# Altium footprint library Connectors Pad Lib.PcbLib: 211 footprints (part 12 of 14)
Each footprint in its own frame and in the unit in brackets; x right, y up, seen from the top. Pads: shape width x height; smd on the part's side, far side on the other; paste and mask are expansions set on the pad; w line width, h text height; cw(c..) or ccw(c..) is an arc to the next point about the centre after c.
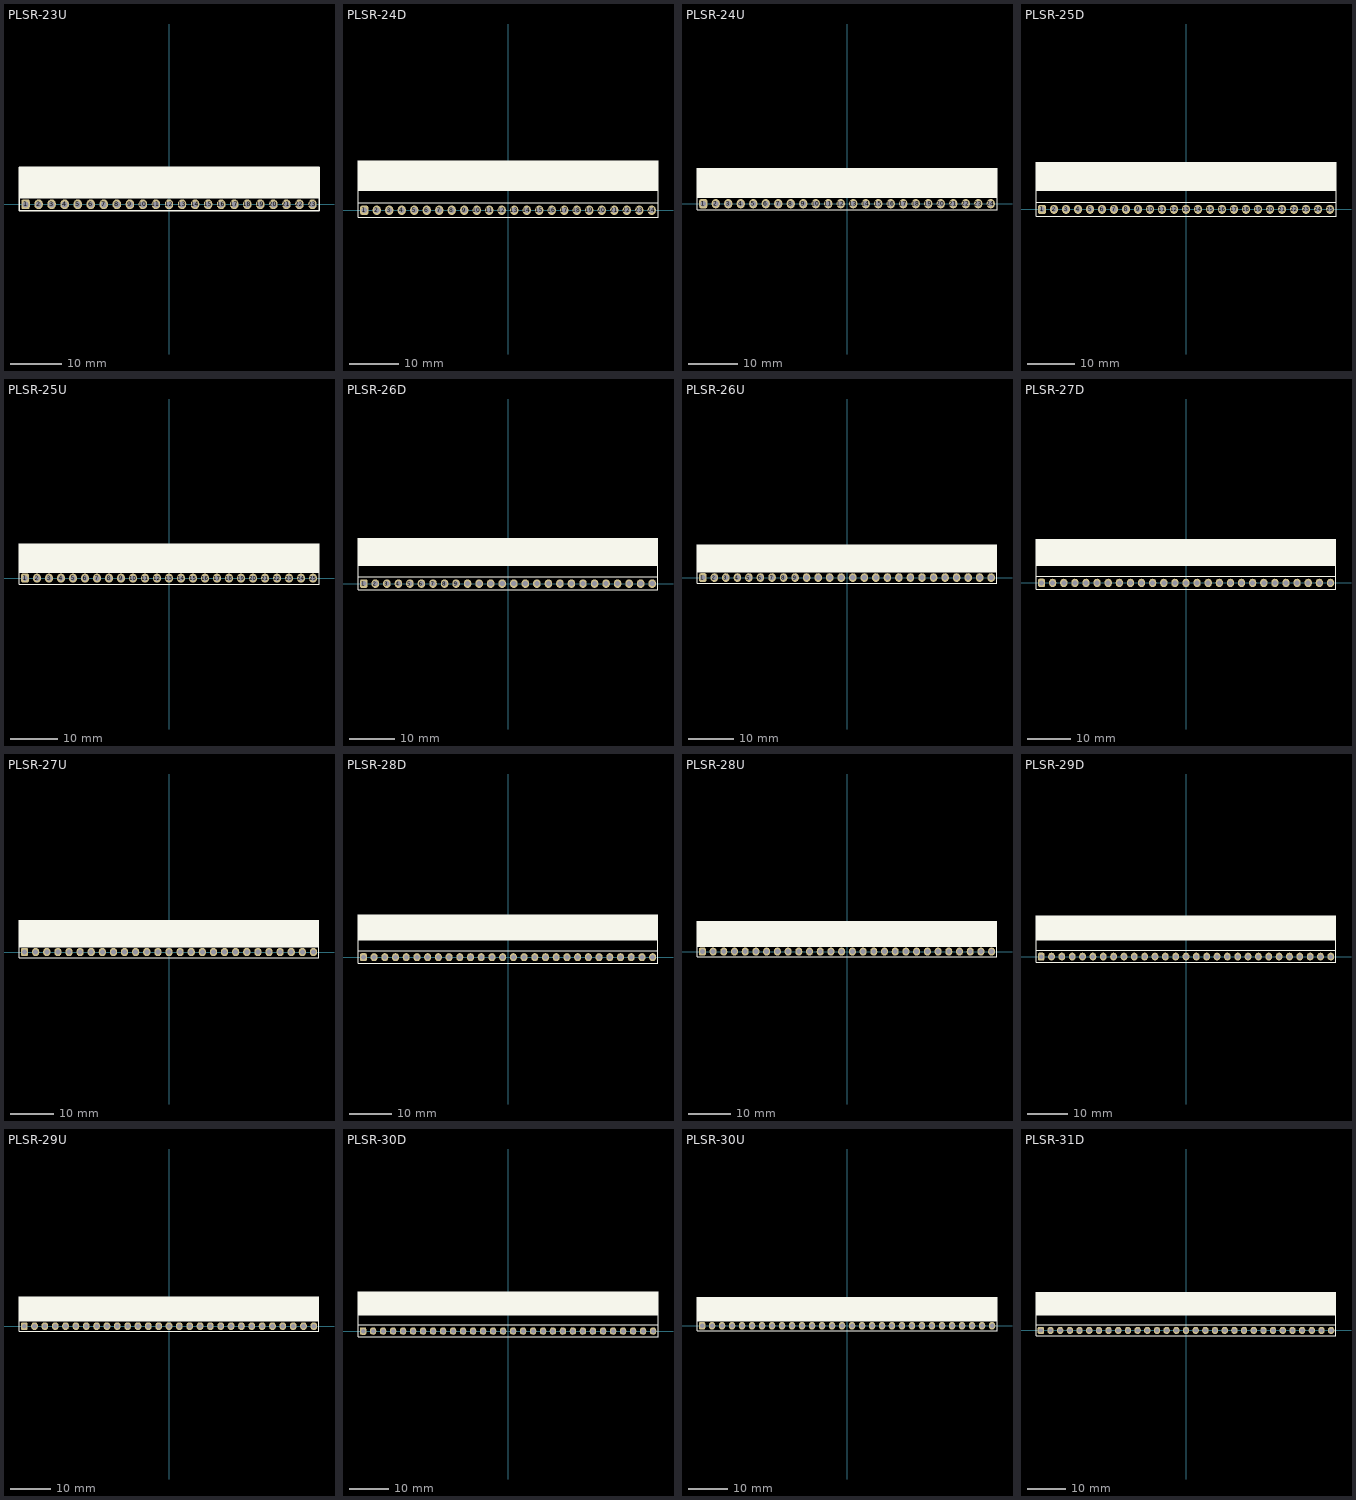
[diagram p11: the footprints below, top view; thin cyan lines are the x and y axes]

## PLSR-23U [mil] "PCB Right Angled Single Connector (U Type) 23-Pin"
height 236.3
pads (23):
  rrect50% 65x75 hole 45: 1(-1100,0)
  oval 65x75 hole 45: 2(-1000,0) 3(-900,0) 4(-800,0) 5(-700,0) 6(-600,0) 7(-500,0) 8(-400,0) 9(-300,0) 10(-200,0) 11(-100,0) 12(0,0) 13(100,0) 14(200,0) 15(300,0) 16(400,0) 17(500,0) 18(600,0) 19(700,0) 20(800,0) 21(900,0) 22(1000,0) 23(1100,0)
Top Overlay:
  rectangle: -1150,50 1150,285
  lines w10: -1150,50 1150,50 ; -1150,-50 -1150,285 1150,285 1150,-50 -1150,-50
3D body "PLSRU-23.STEP": height 239.98, standoff -117.11, extent -1150,-50 1150,286.22

## PLSR-24D [mil] "PCB Right Angled Single Connector (D Type) 24-Pin"
height 98.42
pads (24):
  rrect50% 65x75 hole 45: 1(-1150,0)
  oval 65x75 hole 45: 2(-1050,0) 3(-950,0) 4(-850,0) 5(-750,0) 6(-650,0) 7(-550,0) 8(-450,0) 9(-350,0) 10(-250,0) 11(-150,0) 12(-50,0) 13(50,0) 14(150,0) 15(250,0) 16(350,0) 17(450,0) 18(550,0) 19(650,0) 20(750,0) 21(850,0) 22(950,0) 23(1050,0) 24(1150,0)
Top Overlay:
  rectangle: -1200,160 1200,395
  lines w10: -1200,61 1200,61 ; -1200,161 1200,161 ; -1200,-55 1200,-55 1200,395 -1200,395 -1200,-55
3D body "PLSR-24D.STEP": height 101, standoff -117.11, extent -1200,-11.02 1200,396.85

## PLSR-24U [mil] "PCB Right Angled Single Connector (U Type) 24-Pin"
height 236.3
pads (24):
  rrect50% 65x75 hole 45: 1(-1150,0)
  oval 65x75 hole 45: 2(-1050,0) 3(-950,0) 4(-850,0) 5(-750,0) 6(-650,0) 7(-550,0) 8(-450,0) 9(-350,0) 10(-250,0) 11(-150,0) 12(-50,0) 13(50,0) 14(150,0) 15(250,0) 16(350,0) 17(450,0) 18(550,0) 19(650,0) 20(750,0) 21(850,0) 22(950,0) 23(1050,0) 24(1150,0)
Top Overlay:
  rectangle: -1200,50 1200,285
  lines w10: -1200,50 1200,50 ; -1200,-50 1200,-50 1200,285 -1200,285 -1200,-50
3D body "PLSRU-24.STEP": height 239.98, standoff -117.11, extent -1200,-50 1200,286.22

## PLSR-25D [mil] "PCB Right Angled Single Connector (D Type) 25-Pin"
height 98.42
pads (25):
  rrect50% 65x75 hole 45: 1(-1200,0)
  oval 65x75 hole 45: 2(-1100,0) 3(-1000,0) 4(-900,0) 5(-800,0) 6(-700,0) 7(-600,0) 8(-500,0) 9(-400,0) 10(-300,0) 11(-200,0) 12(-100,0) 13(0,0) 14(100,0) 15(200,0) 16(300,0) 17(400,0) 18(500,0) 19(600,0) 20(700,0) 21(800,0) 22(900,0) 23(1000,0) 24(1100,0) 25(1200,0)
Top Overlay:
  rectangle: -1250,160 1250,395
  lines w10: -1250,61 1250,61 ; -1250,161 1250,161 ; -1250,-55 1250,-55 1250,395 -1250,395 -1250,-55
3D body "PLSR-25D.STEP": height 101, standoff -117.11, extent -1250,-11.02 1250,396.85

## PLSR-25U [mil] "PCB Right Angled Single Connector (U Type) 25-Pin"
height 236.3
pads (25):
  rrect50% 65x75 hole 45: 1(-1200,0)
  oval 65x75 hole 45: 2(-1100,0) 3(-1000,0) 4(-900,0) 5(-800,0) 6(-700,0) 7(-600,0) 8(-500,0) 9(-400,0) 10(-300,0) 11(-200,0) 12(-100,0) 13(0,0) 14(100,0) 15(200,0) 16(300,0) 17(400,0) 18(500,0) 19(600,0) 20(700,0) 21(800,0) 22(900,0) 23(1000,0) 24(1100,0) 25(1200,0)
Top Overlay:
  rectangle: -1250,50 1250,285
  lines w10: -1250,50 1250,50 ; -1250,-50 1250,-50 1250,285 -1250,285 -1250,-50
3D body "PLSRU-25.STEP": height 239.98, standoff -117.11, extent -1250,-50 1250,286.22

## PLSR-26D [mil] "PCB Right Angled Single Connector (D Type) 26-Pin"
height 98.42
pads (26):
  rrect50% 65x75 hole 45: 1(-1250,0)
  oval 65x75 hole 45: 2(-1150,0) 3(-1050,0) 4(-950,0) 5(-850,0) 6(-750,0) 7(-650,0) 8(-550,0) 9(-450,0) 10(-350,0) 11(-250,0) 12(-150,0) 13(-50,0) 14(50,0) 15(150,0) 16(250,0) 17(350,0) 18(450,0) 19(550,0) 20(650,0) 21(750,0) 22(850,0) 23(950,0) 24(1050,0) 25(1150,0) 26(1250,0)
Top Overlay:
  rectangle: -1300,160 1300,395
  lines w10: -1300,61 1300,61 ; -1300,161 1300,161 ; -1300,-55 1300,-55 1300,395 -1300,395 -1300,-55
3D body "PLSR-26D.STEP": height 101, standoff -117.11, extent -1300,-11.02 1300,396.85

## PLSR-26U [mil] "PCB Right Angled Single Connector (U Type) 26-Pin"
height 236.3
pads (26):
  rrect50% 65x75 hole 45: 1(-1250,0)
  oval 65x75 hole 45: 2(-1150,0) 3(-1050,0) 4(-950,0) 5(-850,0) 6(-750,0) 7(-650,0) 8(-550,0) 9(-450,0) 10(-350,0) 11(-250,0) 12(-150,0) 13(-50,0) 14(50,0) 15(150,0) 16(250,0) 17(350,0) 18(450,0) 19(550,0) 20(650,0) 21(750,0) 22(850,0) 23(950,0) 24(1050,0) 25(1150,0) 26(1250,0)
Top Overlay:
  rectangle: -1300,50 1300,285
  lines w10: -1300,50 1300,50 ; -1300,-50 1300,-50 1300,285 -1300,285 -1300,-50
3D body "PLSR-26D.STEP": height 101, standoff -117.11, extent -1300,-11.02 1300,396.85

## PLSR-27D [mil] "PCB Right Angled Single Connector (D Type) 27-Pin"
height 98.42
pads (27):
  rrect50% 65x75 hole 45: 1(-1300,0)
  oval 65x75 hole 45: 2(-1200,0) 3(-1100,0) 4(-1000,0) 5(-900,0) 6(-800,0) 7(-700,0) 8(-600,0) 9(-500,0) 10(-400,0) 11(-300,0) 12(-200,0) 13(-100,0) 14(0,0) 15(100,0) 16(200,0) 17(300,0) 18(400,0) 19(500,0) 20(600,0) 21(700,0) 22(800,0) 23(900,0) 24(1000,0) 25(1100,0) 26(1200,0) 27(1300,0)
Top Overlay:
  rectangle: -1350,160 1350,395
  lines w10: -1350,61 1350,61 ; -1350,161 1350,161 ; -1350,-55 -1350,395 1350,395 1350,-55 -1350,-55
3D body "PLSR-27D.STEP": height 101, standoff -117.11, extent -1350,-11.02 1350,396.85

## PLSR-27U [mil] "PCB Right Angled Single Connector (U Type) 27-Pin"
height 236.3
pads (27):
  rrect50% 65x75 hole 45: 1(-1300,0)
  oval 65x75 hole 45: 2(-1200,0) 3(-1100,0) 4(-1000,0) 5(-900,0) 6(-800,0) 7(-700,0) 8(-600,0) 9(-500,0) 10(-400,0) 11(-300,0) 12(-200,0) 13(-100,0) 14(0,0) 15(100,0) 16(200,0) 17(300,0) 18(400,0) 19(500,0) 20(600,0) 21(700,0) 22(800,0) 23(900,0) 24(1000,0) 25(1100,0) 26(1200,0) 27(1300,0)
Top Overlay:
  rectangle: -1350,50 1350,285
  lines w10: -1350,50 1350,50 ; -1350,-50 1350,-50 1350,285 -1350,285 -1350,-50
3D body "PLSRU-27.STEP": height 239.98, standoff -117.11, extent -1350,-50 1350,286.22

## PLSR-28D [mil] "PCB Right Angled Single Connector (D Type) 28-Pin"
height 98.42
pads (28):
  rrect50% 65x75 hole 45: 1(-1350,0)
  oval 65x75 hole 45: 2(-1250,0) 3(-1150,0) 4(-1050,0) 5(-950,0) 6(-850,0) 7(-750,0) 8(-650,0) 9(-550,0) 10(-450,0) 11(-350,0) 12(-250,0) 13(-150,0) 14(-50,0) 15(50,0) 16(150,0) 17(250,0) 18(350,0) 19(450,0) 20(550,0) 21(650,0) 22(750,0) 23(850,0) 24(950,0) 25(1050,0) 26(1150,0) 27(1250,0) 28(1350,0)
Top Overlay:
  rectangle: -1400,160 1400,395
  lines w10: -1400,61 1400,61 ; -1400,161 1400,161 ; -1400,-55 1400,-55 1400,395 -1400,395 -1400,-55
3D body "PLSR-28D.STEP": height 101, standoff -117.11, extent -1400,-11.02 1400,396.85

## PLSR-28U [mil] "PCB Right Angled Single Connector (U Type) 28-Pin"
height 236.3
pads (28):
  rrect50% 65x75 hole 45: 1(-1350,0)
  oval 65x75 hole 45: 2(-1250,0) 3(-1150,0) 4(-1050,0) 5(-950,0) 6(-850,0) 7(-750,0) 8(-650,0) 9(-550,0) 10(-450,0) 11(-350,0) 12(-250,0) 13(-150,0) 14(-50,0) 15(50,0) 16(150,0) 17(250,0) 18(350,0) 19(450,0) 20(550,0) 21(650,0) 22(750,0) 23(850,0) 24(950,0) 25(1050,0) 26(1150,0) 27(1250,0) 28(1350,0)
Top Overlay:
  rectangle: -1400,50 1400,285
  lines w10: -1400,50 1400,50 ; -1400,-50 1400,-50 1400,285 -1400,285 -1400,-50
3D body "PLSRU-28.STEP": height 239.98, standoff -117.11, extent -1400,-50 1400,286.22

## PLSR-29D [mil] "PCB Right Angled Single Connector (D Type) 29-Pin"
height 98.42
pads (29):
  rrect50% 65x75 hole 45: 1(-1400,0)
  oval 65x75 hole 45: 2(-1300,0) 3(-1200,0) 4(-1100,0) 5(-1000,0) 6(-900,0) 7(-800,0) 8(-700,0) 9(-600,0) 10(-500,0) 11(-400,0) 12(-300,0) 13(-200,0) 14(-100,0) 15(0,0) 16(100,0) 17(200,0) 18(300,0) 19(400,0) 20(500,0) 21(600,0) 22(700,0) 23(800,0) 24(900,0) 25(1000,0) 26(1100,0) 27(1200,0) 28(1300,0) 29(1400,0)
Top Overlay:
  rectangle: -1450,160 1450,395
  lines w10: -1450,61 1450,61 ; -1450,161 1450,161 ; -1450,-55 1450,-55 1450,395 -1450,395 -1450,-55
3D body "PLSR-29D.STEP": height 101, standoff -117.11, extent -1450,-11.02 1450,396.85

## PLSR-29U [mil] "PCB Right Angled Single Connector (U Type) 29-Pin"
height 236.3
pads (29):
  rrect50% 65x75 hole 45: 1(-1400,0)
  oval 65x75 hole 45: 2(-1300,0) 3(-1200,0) 4(-1100,0) 5(-1000,0) 6(-900,0) 7(-800,0) 8(-700,0) 9(-600,0) 10(-500,0) 11(-400,0) 12(-300,0) 13(-200,0) 14(-100,0) 15(0,0) 16(100,0) 17(200,0) 18(300,0) 19(400,0) 20(500,0) 21(600,0) 22(700,0) 23(800,0) 24(900,0) 25(1000,0) 26(1100,0) 27(1200,0) 28(1300,0) 29(1400,0)
Top Overlay:
  rectangle: -1450,50 1450,285
  lines w10: -1450,50 1450,50 ; -1450,-50 1450,-50 1450,285 -1450,285 -1450,-50
3D body "PLSRU-29.STEP": height 239.98, standoff -117.11, extent -1450,-50 1450,286.22

## PLSR-30D [mil] "PCB Right Angled Single Connector (D Type) 30-Pin"
height 98.42
pads (30):
  rrect50% 65x75 hole 45: 1(-1450,0)
  oval 65x75 hole 45: 2(-1350,0) 3(-1250,0) 4(-1150,0) 5(-1050,0) 6(-950,0) 7(-850,0) 8(-750,0) 9(-650,0) 10(-550,0) 11(-450,0) 12(-350,0) 13(-250,0) 14(-150,0) 15(-50,0) 16(50,0) 17(150,0) 18(250,0) 19(350,0) 20(450,0) 21(550,0) 22(650,0) 23(750,0) 24(850,0) 25(950,0) 26(1050,0) 27(1150,0) 28(1250,0) 29(1350,0) 30(1450,0)
Top Overlay:
  rectangle: -1500,160 1500,395
  lines w10: -1500,61 1500,61 ; -1500,161 1500,161 ; -1500,-55 1500,-55 1500,395 -1500,395 -1500,-55
3D body "PLSR-30D.STEP": height 101, standoff -117.11, extent -1500,-11.02 1500,396.85

## PLSR-30U [mil] "PCB Right Angled Single Connector (U Type) 30-Pin"
height 236.3
pads (30):
  rrect50% 65x75 hole 45: 1(-1450,0)
  oval 65x75 hole 45: 2(-1350,0) 3(-1250,0) 4(-1150,0) 5(-1050,0) 6(-950,0) 7(-850,0) 8(-750,0) 9(-650,0) 10(-550,0) 11(-450,0) 12(-350,0) 13(-250,0) 14(-150,0) 15(-50,0) 16(50,0) 17(150,0) 18(250,0) 19(350,0) 20(450,0) 21(550,0) 22(650,0) 23(750,0) 24(850,0) 25(950,0) 26(1050,0) 27(1150,0) 28(1250,0) 29(1350,0) 30(1450,0)
Top Overlay:
  rectangle: -1500,50 1500,285
  lines w10: -1500,50 1500,50 ; -1500,-50 -1500,285 1500,285 1500,-50 -1500,-50
3D body "PLSRU-30.STEP": height 239.98, standoff -117.11, extent -1500,-50 1500,286.22

## PLSR-31D [mil] "PCB Right Angled Single Connector (D Type) 31-Pin"
height 98.42
pads (31):
  rrect50% 65x75 hole 45: 1(-1500,0)
  oval 65x75 hole 45: 2(-1400,0) 3(-1300,0) 4(-1200,0) 5(-1100,0) 6(-1000,0) 7(-900,0) 8(-800,0) 9(-700,0) 10(-600,0) 11(-500,0) 12(-400,0) 13(-300,0) 14(-200,0) 15(-100,0) 16(0,0) 17(100,0) 18(200,0) 19(300,0) 20(400,0) 21(500,0) 22(600,0) 23(700,0) 24(800,0) 25(900,0) 26(1000,0) 27(1100,0) 28(1200,0) 29(1300,0) 30(1400,0) 31(1500,0)
Top Overlay:
  rectangle: -1550,160 1550,395
  lines w10: -1550,61 1550,61 ; -1550,161 1550,161 ; -1550,-55 1550,-55 1550,395 -1550,395 -1550,-55
3D body "PLSR-31D.STEP": height 101, standoff -117.11, extent -1550,-11.02 1550,396.85